# Altium footprint library SparkFun-Retired.PCBLIB: 302 footprints (part 4 of 19)
Each footprint in its own frame and in the unit in brackets; x right, y up, seen from the top. Pads: shape width x height; smd on the part's side, far side on the other; paste and mask are expansions set on the pad; w line width, h text height; cw(c..) or ccw(c..) is an arc to the next point about the centre after c.
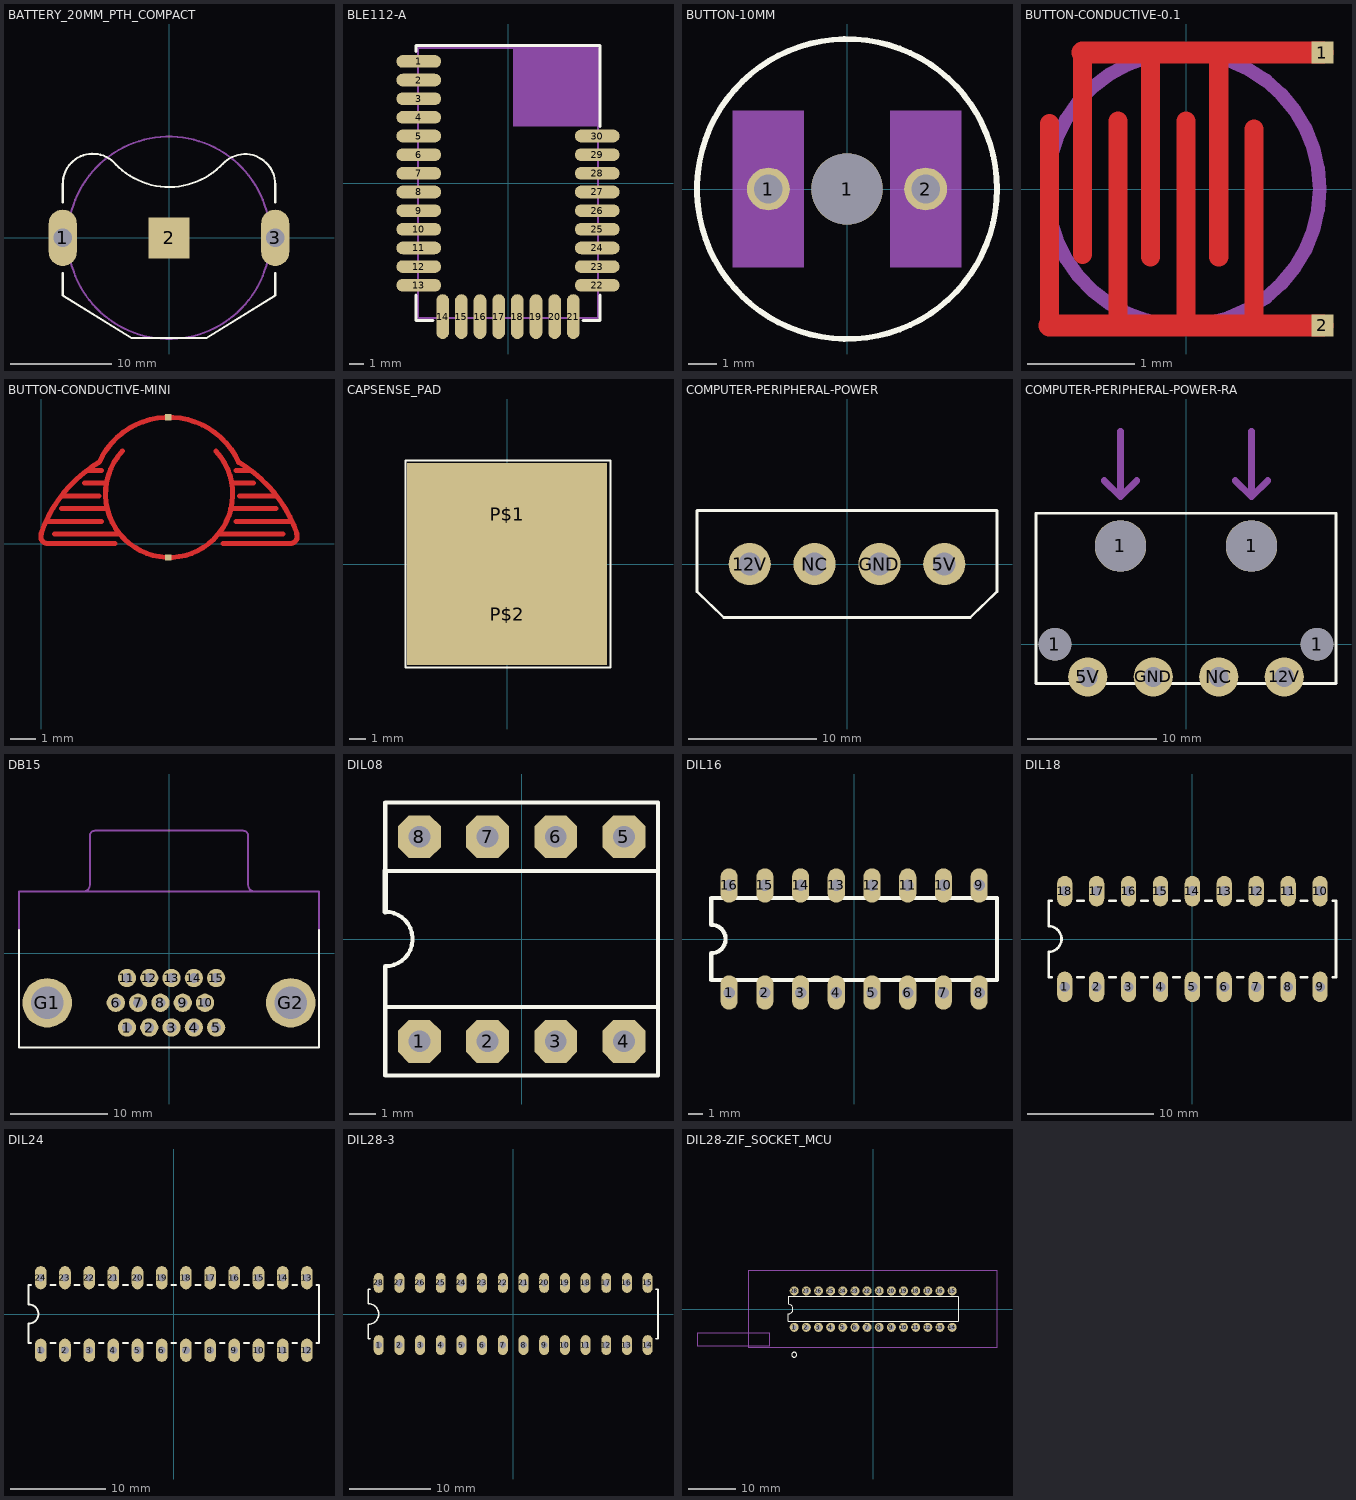
[diagram p3: the footprints below, top view; thin cyan lines are the x and y axes]

## BATTERY_20MM_PTH_COMPACT [mil]
pads (3):
  oval 109.5x219 hole 73: 1(-413.39,0) 3(413.39,0)
  rect 160x160 smd: 2(0,0)
Top Overlay:
  lines w8: -413.39,-137.8 -413.39,-224.41 -145.67,-389.76 145.67,-389.76 413.39,-224.41 413.39,-137.8 ; -413.39,137.8 -413.39,208.66 cw(c-296.55,210.4) -208.66,287.4 ccw(c0.13,485.68) 212.6,291.34 ; 208.66,287.4 cw(c295.52,207.71) 413.39,208.66 413.39,137.8
Mechanical 16:
  circle w8: c0,0 r393.7

## BLE112-A [mm]
pads (30):
  rrect100% 3x0.85 smd: 1(-5.975,8.15) 2(-5.975,6.9) 3(-5.975,5.65) 4(-5.975,4.4) 5(-5.975,3.15) 6(-5.975,1.9) 7(-5.975,0.65) 8(-5.975,-0.6) 9(-5.975,-1.85) 10(-5.975,-3.1) 11(-5.975,-4.35) 12(-5.975,-5.6) 13(-5.975,-6.85) 22(5.975,-6.85) 23(5.975,-5.6) 24(5.975,-4.35) 25(5.975,-3.1) 26(5.975,-1.85) 27(5.975,-0.6) 28(5.975,0.65) 29(5.975,1.9) 30(5.975,3.15)
  rrect100% 0.85x3 smd: 14(-4.375,-8.95) 15(-3.125,-8.95) 16(-1.875,-8.95) 17(-0.625,-8.95) 18(0.625,-8.95) 19(1.875,-8.95) 20(3.125,-8.95) 21(4.375,-8.95)
Top Overlay:
  lines w0.203: -6.175,-7.5 -6.175,-9.2 -5.025,-9.2 ; -6.175,8.8 -6.175,9.2 6.175,9.2 6.175,3.8 ; 5.025,-9.2 6.175,-9.2 6.175,-7.5
Mechanical 16:
  lines w0.127: -6.025,-9.05 -6.025,9.05 6.025,9.05 6.025,-9.05 -6.025,-9.05
Via Holes:
  rectangle: 0.325,3.8 6.025,9.05
Mechanical 27:
  rectangle: 0.325,3.8 6.025,9.05
Mechanical 28:
  rectangle: 0.325,3.8 6.025,9.05

## BUTTON-10MM [mm]
pads (3):
  round 1.5 hole 1: 1(-2.75,0) 2(2.75,0)
  round 2.5 hole 2.5: 1(0,0)
Top Overlay:
  circle w0.203: c0,0 r5.25
Mechanical 11:
  rectangle: -3.25,-2 -2.25,2
  rectangle: 2.25,-2 3.25,2
Mechanical 18:
  rectangle: -4,-2.75 -1.5,2.75
  rectangle: 1.5,-2.75 4,2.75

## BUTTON-CONDUCTIVE-0.1 [mil]
pads (2):
  rect 8x8 smd: 1(50,50) 2(50,-50)
Top Layer:
  lines w7: -50,-50 -50,24 ; -38,-24 -38,50 ; -25,-50 -25,25 ; -13,-25 -13,50 ; 0,-50 0,25 ; 12,-25 12,50 ; 25,-50 25,22
  lines w8: -50,-50 -25,-50 0,-50 25,-50 50,-50 ; -38,50 -13,50 12,50 50,50
Top Solder:
  rectangle: -55,-55 55,55
Mechanical 16:
  circle w5: c-1,0 r50

## BUTTON-CONDUCTIVE-MINI [mil]
pads (2):
  rect 10x10 smd: 1(200,-22) 2(200,199)
Top Layer:
  lines w8: -0.64,15.22 cw(c201,-55) 91,128 cw(c201,78) 311,128 ; 0,15 ccw(c10.5,11) 9.99,-0.22 ; 8,35 95,35 ; 10,0 116,0 ; 21,15 123,15 ; 32,55 104,55 ; 32,75 91,75 ; 68,95 103,95 ; 72,115 95,115 ; 128,146 127,145 ccw(c201,78) 138.89,-0.15 ; 139,0 ccw(c201.5,78) 264,0 ccw(c201.5,78) 275.37,145.33 ; 279,15 381,15 ; 286,0 392,0 ccw(c392,11) 402.34,14.76 ; 298,55 370,55 ; 300,95 334,95 ; 307,35 395,35 ; 307,115 330,115 ; 311.03,128.05 cw(c201.5,-54.99) 403,15 ; 312,75 370,75
Top Solder:
  region: 0,0 10,0 10,10 0,10
  region: 0,0 10,0 10,10 0,10

## CAPSENSE_PAD [mm]
pads (2):
  rect 12x6.1 smd: P$1(0,3) P$2(0,-3)
Top Overlay:
  lines w0.127: -6.1,-6.2 6.2,-6.2 6.2,6.2 -6.1,6.2 -6.1,-6.2

## COMPUTER-PERIPHERAL-POWER [mil]
pads (4):
  round 130 hole 70: 5V(300,0) 12V(-300,0) GND(100,0) NC(-100,0)
Top Overlay:
  lines w8: -462.5,-85 -380,-165 380,-165 462.5,-85 462.5,165 -462.5,165 -462.5,-85

## COMPUTER-PERIPHERAL-POWER-RA [mil]
pads (8):
  round 100 hole 100: 1(-400,0) 1(400,0)
  round 157 hole 157: 1(-200,300) 1(200,300)
  round 120 hole 60: 5V(-300,-100) 12V(300,-100) GND(-100,-100) NC(100,-100)
Top Overlay:
  lines w8: -350,-120 -458,-120 -458,400 458,400 458,-120 350,-120 ; -250,-120 -150,-120 ; -50,-120 50,-120 ; 150,-120 250,-120
Mechanical 16:
  lines w8: -458,-120 458,-120
  lines w20: -250,500 -200,450 ; -200,650 -200,450 ; -150,500 -200,450 ; 150,500 200,450 ; 200,650 200,450 ; 250,500 200,450
  text "INSERT" at -120,525 h77.5

## CREATIVE_COMMONS [mil]
Mechanical 16:
  text "Released under the Creative Commons Attribution Share-Alike 3.0 License" at -800,200 h108.5
  text "https://creativecommons.org/licenses/by-sa/3.0/" at 0,100 h108.5
  text "Designed by:" at 450,0 h108.5

## DB15 [mil]
pads (17):
  round 74 hole 40: 1(-170.08,-300) 2(-79.92,-300) 3(10.24,-300) 4(100.39,-300) 5(190.55,-300) 6(-214.96,-200) 7(-124.8,-200) 8(-34.65,-200) 9(55.51,-200) 10(145.67,-200) 11(-170.08,-100) 12(-79.92,-100) 13(10.24,-100) 14(100.39,-100) 15(190.55,-100)
  round 200 hole 130: G1(-492.13,-200) G2(492.13,-200)
Top Overlay:
  lines w8: -606.3,93.7 -606.3,-379.92 606.3,-379.92 606.3,93.7
Mechanical 16:
  lines w8: -606.3,93.7 -606.3,250 606.3,250 606.3,93.7 ; -345,250.55 ccw(c-345,275.55) -320,275.55 -320,475.55 cw(c-300,475.55) -300,495.55 300,495.55 cw(c300,475.55) 320,475.55 320,275.55 ccw(c345,275.55) 345,250.55

## DIL08 [mil]
pads (8):
  oct 63x63 hole 32: 1(-150,-150) 2(-50,-150) 3(50,-150) 4(150,-150) 5(150,150) 6(50,150) 7(-50,150) 8(-150,150)
Top Overlay:
  lines w6: -200,40 cw(c-200,0) -200,-40 -200,-100 ; -200,-100 -200,-200 200,-200 200,-100 ; -200,-100 200,-100 ; 200,-100 200,100 ; 200,100 200,200 -200,200 -200,100 200,100
  lines w8: -200,40 -200,100

## DIL16 [mil]
pads (16):
  oval 48x96 hole 32: 1(-350,-150) 2(-250,-150) 3(-150,-150) 4(-50,-150) 5(50,-150) 6(150,-150) 7(250,-150) 8(350,-150) 9(350,150) 10(250,150) 11(150,150) 12(50,150) 13(-50,150) 14(-150,150) 15(-250,150) 16(-350,150)
Top Overlay:
  lines w12: -400,-115 400,-115 400,115 -400,115 -400,40 cw(c-400,0) -400,-40 -400,-115

## DIL18 [mil]
pads (18):
  oval 48x96 hole 32: 1(-400,-150) 2(-300,-150) 3(-200,-150) 4(-100,-150) 5(0,-150) 6(100,-150) 7(200,-150) 8(300,-150) 9(400,-150) 10(400,150) 11(300,150) 12(200,150) 13(100,150) 14(0,150) 15(-100,150) 16(-200,150) 17(-300,150) 18(-400,150)
Top Overlay:
  lines w8: -440,-120 -450,-120 -450,-40 ccw(c-450,0) -450,40 -450,120 -440,120 ; -360,-120 -340,-120 ; -360,120 -340,120 ; -260,-120 -240,-120 ; -260,120 -240,120 ; -160,-120 -140,-120 ; -160,120 -140,120 ; -60,-120 -40,-120 ; -60,120 -40,120 ; 40,-120 60,-120 ; 40,120 60,120 ; 140,-120 160,-120 ; 140,120 160,120 ; 240,-120 260,-120 ; 240,120 260,120 ; 340,-120 360,-120 ; 340,120 360,120 ; 440,-120 450,-120 450,120 440,120

## DIL24 [mil]
pads (24):
  oval 48x96 hole 32: 1(-550,-150) 2(-450,-150) 3(-350,-150) 4(-250,-150) 5(-150,-150) 6(-50,-150) 7(50,-150) 8(150,-150) 9(250,-150) 10(350,-150) 11(450,-150) 12(550,-150) 13(550,150) 14(450,150) 15(350,150) 16(250,150) 17(150,150) 18(50,150) 19(-50,150) 20(-150,150) 21(-250,150) 22(-350,150) 23(-450,150) 24(-550,150)
Top Overlay:
  lines w8: -590,-120 -600,-120 -600,-40 ccw(c-600,0) -600,40 -600,120 -590,120 ; -510,-120 -490,-120 ; -510,120 -490,120 ; -410,-120 -390,-120 ; -410,120 -390,120 ; -310,-120 -290,-120 ; -310,120 -290,120 ; -210,-120 -190,-120 ; -210,120 -190,120 ; -110,-120 -90,-120 ; -110,120 -90,120 ; -10,-120 10,-120 ; -10,120 10,120 ; 90,-120 110,-120 ; 90,120 110,120 ; 190,-120 210,-120 ; 190,120 210,120 ; 300,-120 290,-120 310,-120 ; 300,120 290,120 310,120 ; 390,-120 410,-120 ; 390,120 410,120 ; 490,-120 510,-120 ; 490,120 510,120 ; 590,-120 600,-120 600,120 590,120

## DIL28-3 [mil]
pads (28):
  oval 48x96 hole 32: 1(-650,-150) 2(-550,-150) 3(-450,-150) 4(-350,-150) 5(-250,-150) 6(-150,-150) 7(-50,-150) 8(50,-150) 9(150,-150) 10(250,-150) 11(350,-150) 12(450,-150) 13(550,-150) 14(650,-150) 15(650,150) 16(550,150) 17(450,150) 18(350,150) 19(250,150) 20(150,150) 21(50,150) 22(-50,150) 23(-150,150) 24(-250,150) 25(-350,150) 26(-450,150) 27(-550,150) 28(-650,150)
Top Overlay:
  lines w8: -690,-120 -700,-120 -700,-50 ccw(c-700,0) -700,50 -700,120 -690,120 ; 690,-120 700,-120 700,120 690,120

## DIL28-ZIF_SOCKET_MCU [mil]
pads (28):
  round 74 hole 40: 1(-650,-150) 2(-550,-150) 3(-450,-150) 4(-350,-150) 5(-250,-150) 6(-150,-150) 7(-50,-150) 8(50,-150) 9(150,-150) 10(250,-150) 11(350,-150) 12(450,-150) 13(550,-150) 14(650,-150) 15(650,150) 16(550,150) 17(450,150) 18(350,150) 19(250,150) 20(150,150) 21(50,150) 22(-50,150) 23(-150,150) 24(-250,150) 25(-350,150) 26(-450,150) 27(-550,150) 28(-650,150)
Top Overlay:
  circle w10: c-650,-375 r20
  lines w8: -700,-100 700,-100 700,100 -700,100 -700,40 cw(c-700,0) -700,-40 -700,-100
Mechanical 16:
  lines w5: -1027.99,-314.96 1019.25,-314.96 1019.25,314.96 -1027.99,314.96 -1027.99,-314.96
  lines w10: -1450,-300 -1450,-200 -850,-200 -850,-300 -1450,-300